# Altium footprint library MYLIB.PcbLib: 600 footprints (part 30 of 39)
Each footprint in its own frame and in the unit in brackets; x right, y up, seen from the top. Pads: shape width x height; smd on the part's side, far side on the other; paste and mask are expansions set on the pad; w line width, h text height; cw(c..) or ccw(c..) is an arc to the next point about the centre after c.
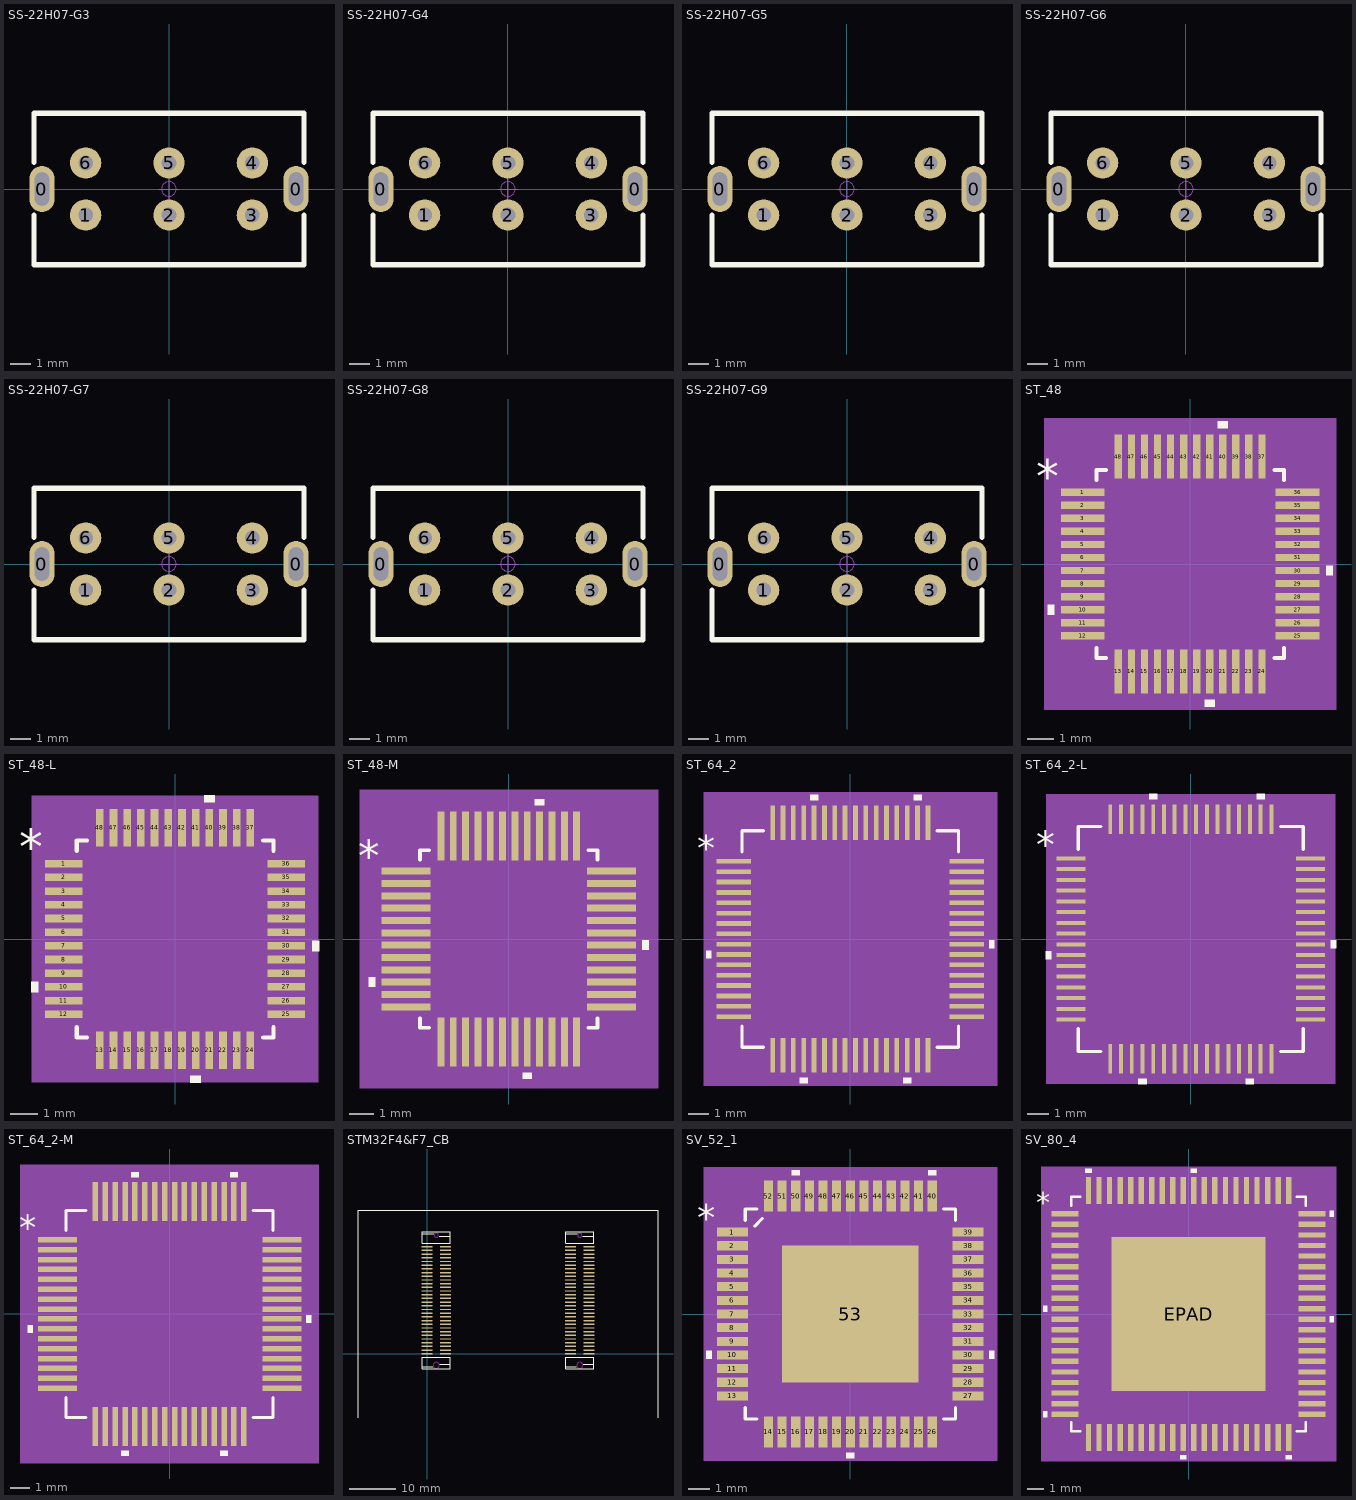
[diagram p29: the footprints below, top view; thin cyan lines are the x and y axes]

## SS-22H07-G3 [mm] "柄长3mm，12.7x7x4.7mm(长宽高)，脚距：4mm"
pads (8):
  oval 1.2x2.2 hole 0.7 slot 1.6 at 90 deg: 0(-6.1,0) 0(6.1,0)
  round 1.5 hole 0.7: 1(-4,-1.25) 2(0,-1.25) 3(4,-1.25) 4(4,1.25) 5(0,1.25) 6(-4,1.25)
Top Overlay:
  lines w0.25: -6.477,-1.25 -6.477,-3.632 6.477,-3.632 6.477,-1.25 ; -6.477,1.27 -6.477,3.632 6.477,3.632 6.477,1.27
Mechanical 15:
  circle w0.05: c0,0 r0.35
  lines w0.05: -0.5,0 0.5,0 ; 0,-0.5 0,0.5
3D body "SS-22H07-G3.STEP": height 7.7, standoff -3.3, extent -6.351,-3.501 6.351,3.501

## SS-22H07-G4 [mm] "柄长4mm，12.7x7x4.7mm(长宽高)，脚距：4mm"
pads (8):
  oval 1.2x2.2 hole 0.7 slot 1.6 at 90 deg: 0(-6.1,0) 0(6.1,0)
  round 1.5 hole 0.7: 1(-4,-1.25) 2(0,-1.25) 3(4,-1.25) 4(4,1.25) 5(0,1.25) 6(-4,1.25)
Top Overlay:
  lines w0.25: -6.477,-1.25 -6.477,-3.632 6.477,-3.632 6.477,-1.25 ; -6.477,1.27 -6.477,3.632 6.477,3.632 6.477,1.27
Mechanical 15:
  circle w0.05: c0,0 r0.35
  lines w0.05: -0.5,0 0.5,0 ; 0,-0.5 0,0.5
3D body "SS-22H07-G4.STEP": height 8.7, standoff -3.3, extent -6.351,-3.501 6.351,3.501

## SS-22H07-G5 [mm] "柄长5mm，12.7x7x4.7mm(长宽高)，脚距：4mm"
pads (8):
  oval 1.2x2.2 hole 0.7 slot 1.6 at 90 deg: 0(-6.1,0) 0(6.1,0)
  round 1.5 hole 0.7: 1(-4,-1.25) 2(0,-1.25) 3(4,-1.25) 4(4,1.25) 5(0,1.25) 6(-4,1.25)
Top Overlay:
  lines w0.25: -6.477,-1.25 -6.477,-3.632 6.477,-3.632 6.477,-1.25 ; -6.477,1.27 -6.477,3.632 6.477,3.632 6.477,1.27
Mechanical 15:
  circle w0.05: c0,0 r0.35
  lines w0.05: -0.5,0 0.5,0 ; 0,-0.5 0,0.5
3D body "SS-22H07-G5.STEP": height 9.7, standoff -3.3, extent -6.351,-3.501 6.351,3.501

## SS-22H07-G6 [mm] "柄长6mm，12.7x7x4.7mm(长宽高)，脚距：4mm"
pads (8):
  oval 1.2x2.2 hole 0.7 slot 1.6 at 90 deg: 0(-6.1,0) 0(6.1,0)
  round 1.5 hole 0.7: 1(-4,-1.25) 2(0,-1.25) 3(4,-1.25) 4(4,1.25) 5(0,1.25) 6(-4,1.25)
Top Overlay:
  lines w0.25: -6.477,-1.25 -6.477,-3.632 6.477,-3.632 6.477,-1.25 ; -6.477,1.27 -6.477,3.632 6.477,3.632 6.477,1.27
Mechanical 15:
  circle w0.05: c0,0 r0.35
  lines w0.05: -0.5,0 0.5,0 ; 0,-0.5 0,0.5
3D body "SS-22H07-G6.STEP": height 10.7, standoff -3.3, extent -6.351,-3.501 6.351,3.501

## SS-22H07-G7 [mm] "柄长7mm，12.7x7x4.7mm(长宽高)，脚距：4mm"
pads (8):
  oval 1.2x2.2 hole 0.7 slot 1.6 at 90 deg: 0(-6.1,0) 0(6.1,0)
  round 1.5 hole 0.7: 1(-4,-1.25) 2(0,-1.25) 3(4,-1.25) 4(4,1.25) 5(0,1.25) 6(-4,1.25)
Top Overlay:
  lines w0.25: -6.477,-1.25 -6.477,-3.632 6.477,-3.632 6.477,-1.25 ; -6.477,1.27 -6.477,3.632 6.477,3.632 6.477,1.27
Mechanical 15:
  circle w0.05: c0,0 r0.35
  lines w0.05: -0.5,0 0.5,0 ; 0,-0.5 0,0.5
3D body "SS-22H07-G7.STEP": height 11.7, standoff -3.3, extent -6.351,-3.501 6.351,3.501

## SS-22H07-G8 [mm] "柄长8mm，12.7x7x4.7mm(长宽高)，脚距：4mm"
pads (8):
  oval 1.2x2.2 hole 0.7 slot 1.6 at 90 deg: 0(-6.1,0) 0(6.1,0)
  round 1.5 hole 0.7: 1(-4,-1.25) 2(0,-1.25) 3(4,-1.25) 4(4,1.25) 5(0,1.25) 6(-4,1.25)
Top Overlay:
  lines w0.25: -6.477,-1.25 -6.477,-3.632 6.477,-3.632 6.477,-1.25 ; -6.477,1.27 -6.477,3.632 6.477,3.632 6.477,1.27
Mechanical 15:
  circle w0.05: c0,0 r0.35
  lines w0.05: -0.5,0 0.5,0 ; 0,-0.5 0,0.5
3D body "SS-22H07-G8.STEP": height 12.7, standoff -3.3, extent -6.351,-3.501 6.351,3.501

## SS-22H07-G9 [mm] "柄长9mm，12.7x7x4.7mm(长宽高)，脚距：4mm"
pads (8):
  oval 1.2x2.2 hole 0.7 slot 1.6 at 90 deg: 0(-6.1,0) 0(6.1,0)
  round 1.5 hole 0.7: 1(-4,-1.25) 2(0,-1.25) 3(4,-1.25) 4(4,1.25) 5(0,1.25) 6(-4,1.25)
Top Overlay:
  lines w0.25: -6.477,-1.25 -6.477,-3.632 6.477,-3.632 6.477,-1.25 ; -6.477,1.27 -6.477,3.632 6.477,3.632 6.477,1.27
Mechanical 15:
  circle w0.05: c0,0 r0.35
  lines w0.05: -0.5,0 0.5,0 ; 0,-0.5 0,0.5
3D body "SS-22H07-G9.STEP": height 13.7, standoff -3.3, extent -6.351,-3.501 6.351,3.501

## ST_48 [mil]
pads (48):
  rect 66x11 smd mask+5: 1(-162,108.27) 2(-162,88.58) 3(-162,68.9) 4(-162,49.21) 5(-162,29.53) 6(-162,9.84) 7(-162,-9.84) 8(-162,-29.53) 9(-162,-49.21) 10(-162,-68.9) 11(-162,-88.58) 12(-162,-108.27) 25(162,-108.27) 26(162,-88.58) 27(162,-68.9) 28(162,-49.21) 29(162,-29.53) 30(162,-9.84) 31(162,9.84) 32(162,29.53) 33(162,49.21) 34(162,68.9) 35(162,88.58) 36(162,108.27)
  rect 11x66 smd mask+5: 13(-108.27,-162) 14(-88.58,-162) 15(-68.9,-162) 16(-49.21,-162) 17(-29.53,-162) 18(-9.84,-162) 19(9.84,-162) 20(29.53,-162) 21(49.21,-162) 22(68.9,-162) 23(88.58,-162) 24(108.27,-162) 37(108.27,162) 38(88.58,162) 39(68.9,162) 40(49.21,162) 41(29.53,162) 42(9.84,162) 43(-9.84,162) 44(-29.53,162) 45(-49.21,162) 46(-68.9,162) 47(-88.58,162) 48(-108.27,162)
Top Overlay:
  region: -205,-61.4 -215,-61.4 -215,-76.4 -205,-76.4
  region: 37.03,-205 22.03,-205 22.03,-215 37.03,-215
  region: 205,-2.34 215,-2.34 215,-17.34 205,-17.34
  region: 56.71,205 41.71,205 41.71,215 56.71,215
  lines w6: -141.5,-126.87 -141.5,-141.5 -126.87,-141.5 ; -141.5,126.87 -141.5,141.5 -126.87,141.5 ; 126.87,-141.5 141.5,-141.5 141.5,-126.87 ; 126.87,141.5 141.5,141.5 141.5,126.87
  text "*" at -232.5,108.11 h50
Mechanical 5:
  region: 220,-220 -220,-220 -220,220 220,220
Mechanical 13:
  drawing of 197 lines, arcs and shapes, not listed
  text "*" at -232.5,108.11 h50
Mechanical 15:
  region: 205,-205 -205,-205 -205,205 205,205
  lines w6: -205,-205 -205,205 205,205 205,-205 -205,-205
3D body: height 10, standoff 0, extent 0,0 10,10

## ST_48-L [mil]
pads (48):
  rect 54x11 smd mask+5: 1(-160,108.27) 2(-160,88.58) 3(-160,68.9) 4(-160,49.21) 5(-160,29.53) 6(-160,9.84) 7(-160,-9.84) 8(-160,-29.53) 9(-160,-49.21) 10(-160,-68.9) 11(-160,-88.58) 12(-160,-108.27) 25(160,-108.27) 26(160,-88.58) 27(160,-68.9) 28(160,-49.21) 29(160,-29.53) 30(160,-9.84) 31(160,9.84) 32(160,29.53) 33(160,49.21) 34(160,68.9) 35(160,88.58) 36(160,108.27)
  rect 11x54 smd mask+5: 13(-108.27,-160) 14(-88.58,-160) 15(-68.9,-160) 16(-49.21,-160) 17(-29.53,-160) 18(-9.84,-160) 19(9.84,-160) 20(29.53,-160) 21(49.21,-160) 22(68.9,-160) 23(88.58,-160) 24(108.27,-160) 37(108.27,160) 38(88.58,160) 39(68.9,160) 40(49.21,160) 41(29.53,160) 42(9.84,160) 43(-9.84,160) 44(-29.53,160) 45(-49.21,160) 46(-68.9,160) 47(-88.58,160) 48(-108.27,160)
Top Overlay:
  region: 56.71,197 41.71,197 41.71,207 56.71,207
  region: 197,-2.34 207,-2.34 207,-17.34 197,-17.34
  region: 37.03,-197 22.03,-197 22.03,-207 37.03,-207
  region: -197,-61.4 -207,-61.4 -207,-76.4 -197,-76.4
  lines w6: -141.5,-126.87 -141.5,-141.5 -126.87,-141.5 ; -141.5,126.87 -141.5,141.5 -126.87,141.5 ; 126.87,-141.5 141.5,-141.5 141.5,-126.87 ; 126.87,141.5 141.5,141.5 141.5,126.87
  text "*" at -224.5,108.11 h50
Mechanical 5:
  region: 206,-206 -206,-206 -206,206 206,206
Mechanical 13:
  drawing of 197 lines, arcs and shapes, not listed
  text "*" at -224.5,108.11 h50
Mechanical 15:
  region: 191,-191 -191,-191 -191,191 191,191
  lines w6: -191,-191 191,-191 191,191 -191,191 -191,-191
3D body: height 10, standoff 0, extent 0,0 10,10

## ST_48-M [mil]
pads (48):
  rect 78x11 smd mask+5: 1(-164,108.27) 2(-164,88.58) 3(-164,68.9) 4(-164,49.21) 5(-164,29.53) 6(-164,9.84) 7(-164,-9.84) 8(-164,-29.53) 9(-164,-49.21) 10(-164,-68.9) 11(-164,-88.58) 12(-164,-108.27) 25(164,-108.27) 26(164,-88.58) 27(164,-68.9) 28(164,-49.21) 29(164,-29.53) 30(164,-9.84) 31(164,9.84) 32(164,29.53) 33(164,49.21) 34(164,68.9) 35(164,88.58) 36(164,108.27)
  rect 11x78 smd mask+5: 13(-108.27,-164) 14(-88.58,-164) 15(-68.9,-164) 16(-49.21,-164) 17(-29.53,-164) 18(-9.84,-164) 19(9.84,-164) 20(29.53,-164) 21(49.21,-164) 22(68.9,-164) 23(88.58,-164) 24(108.27,-164) 37(108.27,164) 38(88.58,164) 39(68.9,164) 40(49.21,164) 41(29.53,164) 42(9.84,164) 43(-9.84,164) 44(-29.53,164) 45(-49.21,164) 46(-68.9,164) 47(-88.58,164) 48(-108.27,164)
Top Overlay:
  region: -213,-61.4 -223,-61.4 -223,-76.4 -213,-76.4
  region: 37.03,-213 22.03,-213 22.03,-223 37.03,-223
  region: 213,-2.34 223,-2.34 223,-17.34 213,-17.34
  region: 56.71,213 41.71,213 41.71,223 56.71,223
  lines w6: -141.5,-126.87 -141.5,-141.5 -126.87,-141.5 ; -141.5,126.87 -141.5,141.5 -126.87,141.5 ; 126.87,-141.5 141.5,-141.5 141.5,-126.87 ; 126.87,141.5 141.5,141.5 141.5,126.87
  text "*" at -240.5,108.11 h50
Mechanical 5:
  region: 238,-238 -238,-238 -238,238 238,238
Mechanical 13:
  drawing of 197 lines, arcs and shapes, not listed
  text "*" at -240.5,108.11 h50
Mechanical 15:
  region: 223,-223 -223,-223 -223,223 223,223
  lines w6: -223,-223 -223,223 223,223 223,-223 -223,-223
3D body: height 10, standoff 0, extent 0,0 10,10

## ST_64_2 [mil]
pads (64):
  rect 65.5x9 smd paste+0 mask+0: 1(-221.25,147.64) 2(-221.25,127.95) 3(-221.25,108.27) 4(-221.25,88.58) 5(-221.25,68.9) 6(-221.25,49.21) 7(-221.25,29.53) 8(-221.25,9.84) 9(-221.25,-9.84) 10(-221.25,-29.53) 11(-221.25,-49.21) 12(-221.25,-68.9) 13(-221.25,-88.58) 14(-221.25,-108.27) 15(-221.25,-127.95) 16(-221.25,-147.64) 33(221.25,-147.64) 34(221.25,-127.95) 35(221.25,-108.27) 36(221.25,-88.58) 37(221.25,-68.9) 38(221.25,-49.21) 39(221.25,-29.53) 40(221.25,-9.84) 41(221.25,9.84) 42(221.25,29.53) 43(221.25,49.21) 44(221.25,68.9) 45(221.25,88.58) 46(221.25,108.27) 47(221.25,127.95) 48(221.25,147.64)
  rect 9x65.5 smd paste+0 mask+0: 17(-147.64,-221.25) 18(-127.95,-221.25) 19(-108.27,-221.25) 20(-88.58,-221.25) 21(-68.9,-221.25) 22(-49.21,-221.25) 23(-29.53,-221.25) 24(-9.84,-221.25) 25(9.84,-221.25) 26(29.53,-221.25) 27(49.21,-221.25) 28(68.9,-221.25) 29(88.58,-221.25) 30(108.27,-221.25) 31(127.95,-221.25) 32(147.64,-221.25) 49(147.64,221.25) 50(127.95,221.25) 51(108.27,221.25) 52(88.58,221.25) 53(68.9,221.25) 54(49.21,221.25) 55(29.53,221.25) 56(9.84,221.25) 57(-9.84,221.25) 58(-29.53,221.25) 59(-49.21,221.25) 60(-68.9,221.25) 61(-88.58,221.25) 62(-108.27,221.25) 63(-127.95,221.25) 64(-147.64,221.25)
Top Overlay:
  region: -264,-22.03 -274,-22.03 -274,-37.03 -264,-37.03
  region: -81.08,-264 -96.08,-264 -96.08,-274 -81.08,-274
  region: 115.77,-264 100.77,-264 100.77,-274 115.77,-274
  region: 264,-2.34 274,-2.34 274,-17.34 264,-17.34
  region: 135.45,264 120.45,264 120.45,274 135.45,274
  region: -61.4,264 -76.4,264 -76.4,274 -61.4,274
  lines w6: -206,-165.24 -206,-206 -165.24,-206 ; -206,165.24 -206,206 -165.24,206 ; 165.24,-206 206,-206 206,-165.24 ; 165.24,206 206,206 206,165.24
  text "*" at -291.5,147.48 h50
Mechanical 5:
  region: 279,-279 -279,-279 -279,279 279,279
Mechanical 13:
  drawing of 261 lines, arcs and shapes, not listed
  text "*" at -198.5,132.48 h50
Mechanical 15:
  region: -162.14,-211 -211,-211 -211,-162.14 -264,-162.14 -264,162.14 -211,162.14 -211,211 -162.14,211 -162.14,264 162.14,264 162.14,211 211,211 211,162.14 264,162.14 264,-162.14 211,-162.14 211,-211 162.14,-211 162.14,-264 -162.14,-264
  lines w6: -264,-162.14 -211,-162.14 -211,-211 -162.14,-211 -162.14,-264 162.14,-264 162.14,-211 211,-211 211,-162.14 264,-162.14 264,162.14 211,162.14 211,211 162.14,211 162.14,264 -162.14,264 -162.14,211 -211,211 -211,162.14 -264,162.14 -264,-162.14
3D body: height 10, standoff 0, extent 0,0 10,10

## ST_64_2-L [mil]
pads (64):
  rect 53.5x7 smd paste+0 mask+0: 1(-219.25,147.64) 2(-219.25,127.95) 3(-219.25,108.27) 4(-219.25,88.58) 5(-219.25,68.9) 6(-219.25,49.21) 7(-219.25,29.53) 8(-219.25,9.84) 9(-219.25,-9.84) 10(-219.25,-29.53) 11(-219.25,-49.21) 12(-219.25,-68.9) 13(-219.25,-88.58) 14(-219.25,-108.27) 15(-219.25,-127.95) 16(-219.25,-147.64) 33(219.25,-147.64) 34(219.25,-127.95) 35(219.25,-108.27) 36(219.25,-88.58) 37(219.25,-68.9) 38(219.25,-49.21) 39(219.25,-29.53) 40(219.25,-9.84) 41(219.25,9.84) 42(219.25,29.53) 43(219.25,49.21) 44(219.25,68.9) 45(219.25,88.58) 46(219.25,108.27) 47(219.25,127.95) 48(219.25,147.64)
  rect 7x53.5 smd paste+0 mask+0: 17(-147.64,-219.25) 18(-127.95,-219.25) 19(-108.27,-219.25) 20(-88.58,-219.25) 21(-68.9,-219.25) 22(-49.21,-219.25) 23(-29.53,-219.25) 24(-9.84,-219.25) 25(9.84,-219.25) 26(29.53,-219.25) 27(49.21,-219.25) 28(68.9,-219.25) 29(88.58,-219.25) 30(108.27,-219.25) 31(127.95,-219.25) 32(147.64,-219.25) 49(147.64,219.25) 50(127.95,219.25) 51(108.27,219.25) 52(88.58,219.25) 53(68.9,219.25) 54(49.21,219.25) 55(29.53,219.25) 56(9.84,219.25) 57(-9.84,219.25) 58(-29.53,219.25) 59(-49.21,219.25) 60(-68.9,219.25) 61(-88.58,219.25) 62(-108.27,219.25) 63(-127.95,219.25) 64(-147.64,219.25)
Top Overlay:
  region: -61.4,256 -76.4,256 -76.4,266 -61.4,266
  region: 135.45,256 120.45,256 120.45,266 135.45,266
  region: 256,-2.34 266,-2.34 266,-17.34 256,-17.34
  region: 115.77,-256 100.77,-256 100.77,-266 115.77,-266
  region: -81.08,-256 -96.08,-256 -96.08,-266 -81.08,-266
  region: -256,-22.03 -266,-22.03 -266,-37.03 -256,-37.03
  lines w6: -206,-164.24 -206,-206 -164.24,-206 ; -206,164.24 -206,206 -164.24,206 ; 164.24,-206 206,-206 206,-164.24 ; 164.24,206 206,206 206,164.24
  text "*" at -283.5,147.48 h50
Mechanical 5:
  region: 265,-265 -265,-265 -265,265 265,265
Mechanical 13:
  drawing of 261 lines, arcs and shapes, not listed
  text "*" at -198.5,132.48 h50
Mechanical 15:
  region: -155.14,-205 -205,-205 -205,-155.14 -250,-155.14 -250,155.14 -205,155.14 -205,205 -155.14,205 -155.14,250 155.14,250 155.14,205 205,205 205,155.14 250,155.14 250,-155.14 205,-155.14 205,-205 155.14,-205 155.14,-250 -155.14,-250
  lines w6: -250,-155.14 -250,155.14 -205,155.14 -205,205 -155.14,205 -155.14,250 155.14,250 155.14,205 205,205 205,155.14 250,155.14 250,-155.14 205,-155.14 205,-205 155.14,-205 155.14,-250 -155.14,-250 -155.14,-205 -205,-205 -205,-155.14 -250,-155.14
3D body: height 10, standoff 0, extent 0,0 10,10

## ST_64_2-M [mil]
pads (64):
  rect 77.5x11 smd paste+0 mask+0: 1(-223.25,147.64) 2(-223.25,127.95) 3(-223.25,108.27) 4(-223.25,88.58) 5(-223.25,68.9) 6(-223.25,49.21) 7(-223.25,29.53) 8(-223.25,9.84) 9(-223.25,-9.84) 10(-223.25,-29.53) 11(-223.25,-49.21) 12(-223.25,-68.9) 13(-223.25,-88.58) 14(-223.25,-108.27) 15(-223.25,-127.95) 16(-223.25,-147.64) 33(223.25,-147.64) 34(223.25,-127.95) 35(223.25,-108.27) 36(223.25,-88.58) 37(223.25,-68.9) 38(223.25,-49.21) 39(223.25,-29.53) 40(223.25,-9.84) 41(223.25,9.84) 42(223.25,29.53) 43(223.25,49.21) 44(223.25,68.9) 45(223.25,88.58) 46(223.25,108.27) 47(223.25,127.95) 48(223.25,147.64)
  rect 11x77.5 smd paste+0 mask+0: 17(-147.64,-223.25) 18(-127.95,-223.25) 19(-108.27,-223.25) 20(-88.58,-223.25) 21(-68.9,-223.25) 22(-49.21,-223.25) 23(-29.53,-223.25) 24(-9.84,-223.25) 25(9.84,-223.25) 26(29.53,-223.25) 27(49.21,-223.25) 28(68.9,-223.25) 29(88.58,-223.25) 30(108.27,-223.25) 31(127.95,-223.25) 32(147.64,-223.25) 49(147.64,223.25) 50(127.95,223.25) 51(108.27,223.25) 52(88.58,223.25) 53(68.9,223.25) 54(49.21,223.25) 55(29.53,223.25) 56(9.84,223.25) 57(-9.84,223.25) 58(-29.53,223.25) 59(-49.21,223.25) 60(-68.9,223.25) 61(-88.58,223.25) 62(-108.27,223.25) 63(-127.95,223.25) 64(-147.64,223.25)
Top Overlay:
  region: -272,-22.03 -282,-22.03 -282,-37.03 -272,-37.03
  region: -81.08,-272 -96.08,-272 -96.08,-282 -81.08,-282
  region: 115.77,-272 100.77,-272 100.77,-282 115.77,-282
  region: 272,-2.34 282,-2.34 282,-17.34 272,-17.34
  region: 135.45,272 120.45,272 120.45,282 135.45,282
  region: -61.4,272 -76.4,272 -76.4,282 -61.4,282
  lines w6: -206,-166.24 -206,-206 -166.24,-206 ; -206,166.24 -206,206 -166.24,206 ; 166.24,-206 206,-206 206,-166.24 ; 166.24,206 206,206 206,166.24
  text "*" at -299.5,147.48 h50
Mechanical 5:
  region: 297,-297 -297,-297 -297,297 297,297
Mechanical 13:
  drawing of 261 lines, arcs and shapes, not listed
  text "*" at -198.5,132.48 h50
Mechanical 15:
  region: -173.14,-221 -221,-221 -221,-173.14 -282,-173.14 -282,173.14 -221,173.14 -221,221 -173.14,221 -173.14,282 173.14,282 173.14,221 221,221 221,173.14 282,173.14 282,-173.14 221,-173.14 221,-221 173.14,-221 173.14,-282 -173.14,-282
  lines w6: -282,-173.14 -221,-173.14 -221,-221 -173.14,-221 -173.14,-282 173.14,-282 173.14,-221 221,-221 221,-173.14 282,-173.14 282,173.14 221,173.14 221,221 173.14,221 173.14,282 -173.14,282 -173.14,221 -221,221 -221,173.14 -282,173.14 -282,-173.14
3D body: height 10, standoff 0, extent 0,0 10,10

## STM32F4&F7_CB [mm]
pads (120):
  rect 2.3x0.3 smd: J1_1(0,0) J1_2(0,0.8) J1_3(0,1.6) J1_4(0,2.4) J1_5(0,3.2) J1_6(0,4) J1_7(0,4.8) J1_8(0,5.6) J1_9(0,6.4) J1_10(0,7.2) J1_11(0,8) J1_12(0,8.8) J1_13(0,9.6) J1_14(0,10.4) J1_15(0,11.2) J1_16(0,12) J1_17(0,12.8) J1_18(0,13.6) J1_19(0,14.4) J1_20(0,15.2) J1_21(0,16) J1_22(0,16.8) J1_23(0,17.6) J1_24(0,18.4) J1_25(0,19.2) J1_26(0,20) J1_27(0,20.8) J1_28(0,21.6) J1_29(0,22.4) J1_30(0,23.2) J1_31(4,23.2) J1_32(4,22.4) J1_33(4,21.6) J1_34(4,20.8) J1_35(4,20) J1_36(4,19.2) J1_37(4,18.4) J1_38(4,17.6) J1_39(4,16.8) J1_40(4,16) J1_41(4,15.2) J1_42(4,14.4) J1_43(4,13.6) J1_44(4,12.8) J1_45(4,12) J1_46(4,11.2) J1_47(4,10.4) J1_48(4,9.6) J1_49(4,8.8) J1_50(4,8) J1_51(4,7.2) J1_52(4,6.4) J1_53(4,5.6) J1_54(4,4.8) J1_55(4,4) J1_56(4,3.2) J1_57(4,2.4) J1_58(4,1.6) J1_59(4,0.8) J1_60(4,0) J2_1(31.1,0.001) J2_2(31.1,0.801) J2_3(31.1,1.601) J2_4(31.1,2.401) J2_5(31.1,3.201) J2_6(31.1,4.001) J2_7(31.1,4.801) J2_8(31.1,5.601) J2_9(31.1,6.401) J2_10(31.1,7.201) J2_11(31.1,8.001) J2_12(31.1,8.801) J2_13(31.1,9.601) J2_14(31.1,10.401) J2_15(31.1,11.201) J2_16(31.1,12.001) J2_17(31.1,12.801) J2_18(31.1,13.601) J2_19(31.1,14.401) J2_20(31.1,15.201) J2_21(31.1,16.001) J2_22(31.1,16.801) J2_23(31.1,17.601) J2_24(31.1,18.401) J2_25(31.1,19.201) J2_26(31.1,20.001) J2_27(31.1,20.801) J2_28(31.1,21.601) J2_29(31.1,22.401) J2_30(31.1,23.201) J2_31(35.1,23.201) J2_32(35.1,22.401) J2_33(35.1,21.601) J2_34(35.1,20.801) J2_35(35.1,20.001) J2_36(35.1,19.201) J2_37(35.1,18.401) J2_38(35.1,17.601) J2_39(35.1,16.801) J2_40(35.1,16.001) J2_41(35.1,15.201) J2_42(35.1,14.401) J2_43(35.1,13.601) J2_44(35.1,12.801) J2_45(35.1,12.001) J2_46(35.1,11.201) J2_47(35.1,10.401) J2_48(35.1,9.601) J2_49(35.1,8.801) J2_50(35.1,8.001) J2_51(35.1,7.201) J2_52(35.1,6.401) J2_53(35.1,5.601) J2_54(35.1,4.801) J2_55(35.1,4.001) J2_56(35.1,3.201) J2_57(35.1,2.401) J2_58(35.1,1.601) J2_59(35.1,0.801) J2_60(35.1,0.001)
Top Overlay:
  lines w0.152: -14.95,-13.874 -14.95,31.126 50.05,31.126 50.05,-13.874 ; -1,-2.8 1.2,-2.8 ; -1,-0.775 -1,-3.275 5,-3.275 5,-0.775 -0.975,-0.775 ; -1,26 1.5,26 ; 2.6,25.5 5,25.5 ; 2.8,-2.3 5,-2.3 ; 30.1,-2.799 32.3,-2.799 ; 30.1,-0.774 30.1,-3.274 36.1,-3.274 36.1,-0.774 30.125,-0.774 ; 30.1,26.001 32.6,26.001 ; 33.7,25.501 36.1,25.501 ; 33.9,-2.299 36.1,-2.299 ; -1,23.975 -1,26.475 5,26.475 5,23.975 -1,23.975 ; 30.1,23.976 36.1,23.976 36.1,26.476 30.1,26.476 30.1,23.976
Keep-Out Layer:
  circle w0.152: c33.1,25.701 r0.45
  circle w0.152: c33.1,-2.499 r0.65
  circle w0.152: c2,-2.5 r0.65
  circle w0.152: c2,25.7 r0.45

## SV_52_1 [mil]
pads (53):
  rect 58x17 smd: 1(-221,153.54) 2(-221,127.95) 3(-221,102.36) 4(-221,76.77) 5(-221,51.18) 6(-221,25.59) 7(-221,0) 8(-221,-25.59) 9(-221,-51.18) 10(-221,-76.77) 11(-221,-102.36) 12(-221,-127.95) 13(-221,-153.54) 27(221,-153.54) 28(221,-127.95) 29(221,-102.36) 30(221,-76.77) 31(221,-51.18) 32(221,-25.59) 33(221,0) 34(221,25.59) 35(221,51.18) 36(221,76.77) 37(221,102.36) 38(221,127.95) 39(221,153.54)
  rect 17x58 smd: 14(-153.54,-221) 15(-127.95,-221) 16(-102.36,-221) 17(-76.77,-221) 18(-51.18,-221) 19(-25.59,-221) 20(0,-221) 21(25.59,-221) 22(51.18,-221) 23(76.77,-221) 24(102.36,-221) 25(127.95,-221) 26(153.54,-221) 40(153.54,221) 41(127.95,221) 42(102.36,221) 43(76.77,221) 44(51.18,221) 45(25.59,221) 46(0,221) 47(-25.59,221) 48(-51.18,221) 49(-76.77,221) 50(-102.36,221) 51(-127.95,221) 52(-153.54,221)
  rect 256x256 smd: 53(0,0)
Top Overlay:
  region: -94.86,260 -109.86,260 -109.86,270 -94.86,270
  region: 161.04,260 146.04,260 146.04,270 161.04,270
  region: 260,-69.27 270,-69.27 270,-84.27 260,-84.27
  region: 7.5,-260 -7.5,-260 -7.5,-270 7.5,-270
  region: -260,-69.27 -270,-69.27 -270,-84.27 -260,-84.27
  lines w6: -197,-175.04 -197,-197 -175.04,-197 ; -197,175.04 -197,197 -175.04,197 ; -179.28,164.72 -164.72,179.28 ; 175.04,-197 197,-197 197,-175.04 ; 175.04,197 197,197 197,175.04
  text "*" at -287.5,156.34 h50
Mechanical 5:
  region: 275,-275 -275,-275 -275,275 275,275
Mechanical 13:
  drawing of 213 lines, arcs and shapes, not listed
  text "*" at -287.5,156.34 h50
Mechanical 15:
  region: 260,-260 -260,-260 -260,260 260,260
  lines w6: -260,-260 260,-260 260,260 -260,260 -260,-260
3D body: height 10, standoff 0, extent 0,0 10,10

## SV_80_4 [mil]
pads (81):
  rect 66x13 smd paste+0 mask+0: 1(-300,243.11) 2(-300,217.52) 3(-300,191.93) 4(-300,166.34) 5(-300,140.75) 6(-300,115.16) 7(-300,89.57) 8(-300,63.98) 9(-300,38.39) 10(-300,12.8) 11(-300,-12.8) 12(-300,-38.39) 13(-300,-63.98) 14(-300,-89.57) 15(-300,-115.16) 16(-300,-140.75) 17(-300,-166.34) 18(-300,-191.93) 19(-300,-217.52) 20(-300,-243.11) 41(300,-243.11) 42(300,-217.52) 43(300,-191.93) 44(300,-166.34) 45(300,-140.75) 46(300,-115.16) 47(300,-89.57) 48(300,-63.98) 49(300,-38.39) 50(300,-12.8) 51(300,12.8) 52(300,38.39) 53(300,63.98) 54(300,89.57) 55(300,115.16) 56(300,140.75) 57(300,166.34) 58(300,191.93) 59(300,217.52) 60(300,243.11)
  rect 13x66 smd paste+0 mask+0: 21(-243.11,-300) 22(-217.52,-300) 23(-191.93,-300) 24(-166.34,-300) 25(-140.75,-300) 26(-115.16,-300) 27(-89.57,-300) 28(-63.98,-300) 29(-38.39,-300) 30(-12.8,-300) 31(12.8,-300) 32(38.39,-300) 33(63.98,-300) 34(89.57,-300) 35(115.16,-300) 36(140.75,-300) 37(166.34,-300) 38(191.93,-300) 39(217.52,-300) 40(243.11,-300) 61(243.11,300) 62(217.52,300) 63(191.93,300) 64(166.34,300) 65(140.75,300) 66(115.16,300) 67(89.57,300) 68(63.98,300) 69(38.39,300) 70(12.8,300) 71(-12.8,300) 72(-38.39,300) 73(-63.98,300) 74(-89.57,300) 75(-115.16,300) 76(-140.75,300) 77(-166.34,300) 78(-191.93,300) 79(-217.52,300) 80(-243.11,300)
  rect 374x374 smd paste-186.5 mask+0: EPAD(0,0)
Top Overlay:
  region: -343,20.3 -353,20.3 -353,5.3 -343,5.3
  region: -343,-235.61 -353,-235.61 -353,-250.61 -343,-250.61
  region: -5.3,-343 -20.3,-343 -20.3,-353 -5.3,-353
  region: 250.61,-343 235.61,-343 235.61,-353 250.61,-353
  region: 343,-5.3 353,-5.3 353,-20.3 343,-20.3
  region: 343,250.61 353,250.61 353,235.61 343,235.61
  region: 20.3,343 5.3,343 5.3,353 20.3,353
  region: -235.61,343 -250.61,343 -250.61,353 -235.61,353
  lines w6: -284.5,-262.71 -284.5,-284.5 -262.71,-284.5 ; -284.5,262.71 -284.5,284.5 -262.71,284.5 ; 262.71,-284.5 284.5,-284.5 284.5,-262.71 ; 262.71,284.5 284.5,284.5 284.5,262.71
  text "*" at -370.5,245.91 h50
Top Paste:
  drawing of 49 lines, arcs and shapes, not listed
Mechanical 5:
  region: 358,-358 -358,-358 -358,358 358,358
Mechanical 13:
  drawing of 325 lines, arcs and shapes, not listed
  text "*" at -277,230.91 h50
Mechanical 15:
  region: -259.61,-289.5 -289.5,-289.5 -289.5,-259.61 -343,-259.61 -343,259.61 -289.5,259.61 -289.5,289.5 -259.61,289.5 -259.61,343 259.61,343 259.61,289.5 289.5,289.5 289.5,259.61 343,259.61 343,-259.61 289.5,-259.61 289.5,-289.5 259.61,-289.5 259.61,-343 -259.61,-343
  lines w6: -343,-259.61 -289.5,-259.61 -289.5,-289.5 -259.61,-289.5 -259.61,-343 259.61,-343 259.61,-289.5 289.5,-289.5 289.5,-259.61 343,-259.61 343,259.61 289.5,259.61 289.5,289.5 259.61,289.5 259.61,343 -259.61,343 -259.61,289.5 -289.5,289.5 -289.5,259.61 -343,259.61 -343,-259.61
3D body: height 10, standoff 0, extent 0,0 10,10